# Altium footprint library PcbLib1.PcbLib: 148 footprints (part 2 of 10)
Each footprint in its own frame and in the unit in brackets; x right, y up, seen from the top. Pads: shape width x height; smd on the part's side, far side on the other; paste and mask are expansions set on the pad; w line width, h text height; cw(c..) or ccw(c..) is an arc to the next point about the centre after c.
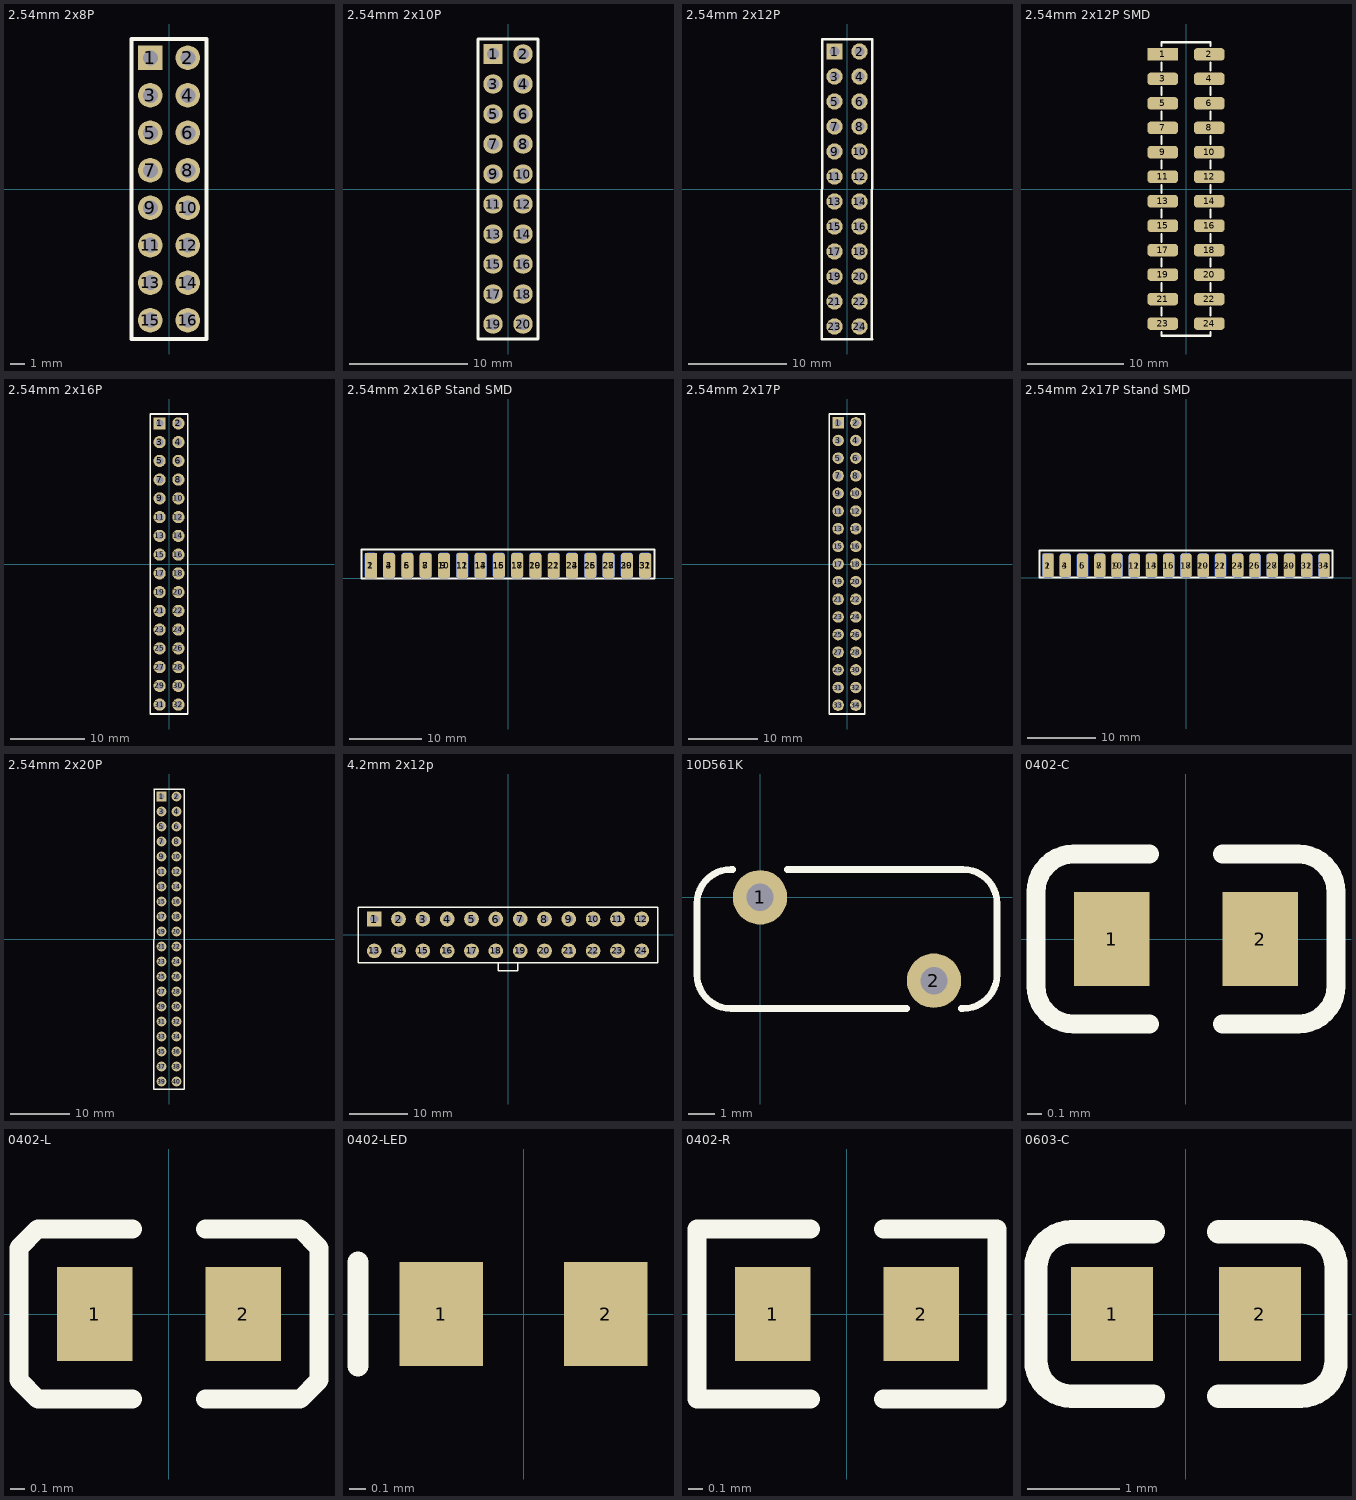
[diagram p1: the footprints below, top view; thin cyan lines are the x and y axes]

## 2.54mm 2x8P [mil]
pads (16):
  rect 65x65 hole 40: 1(-50,350)
  round 65 hole 40: 2(50,350) 3(-50,250) 4(50,250) 5(-50,150) 6(50,150) 7(-50,50) 8(50,50) 9(-50,-50) 10(50,-50) 11(-50,-150) 12(50,-150) 13(-50,-250) 14(50,-250) 15(-50,-350) 16(50,-350)
Top Overlay:
  lines w10: -100,-400 -100,400 100,400 100,-400 -100,-400

## 2.54mm 2x10P [mil]
pads (20):
  rect 65x65 hole 40: 1(-50,450)
  round 65 hole 40: 2(50,450) 3(-50,350) 4(50,350) 5(-50,250) 6(50,250) 7(-50,150) 8(50,150) 9(-50,50) 10(50,50) 11(-50,-50) 12(50,-50) 13(-50,-150) 14(50,-150) 15(-50,-250) 16(50,-250) 17(-50,-350) 18(50,-350) 19(-50,-450) 20(50,-450)
Top Overlay:
  lines w10: -100,-500 100,-500 100,500 -100,500 -100,-500

## 2.54mm 2x12P [mil]
pads (24):
  rect 65x65 hole 40: 1(-50,550)
  round 65 hole 40: 2(50,550) 3(-50,450) 4(50,450) 5(-50,350) 6(50,350) 7(-50,250) 8(50,250) 9(-50,150) 10(50,150) 11(-50,50) 12(50,50) 13(-50,-50) 14(50,-50) 15(-50,-150) 16(50,-150) 17(-50,-250) 18(50,-250) 19(-50,-350) 20(50,-350) 21(-50,-450) 22(50,-450) 23(-50,-550) 24(50,-550)
Top Overlay:
  lines w10: -100,-600 -100,600 100,600 100,-600 -100,-600

## 2.54mm 2x12P SMD [mil]
pads (24):
  rect 125x50 smd: 1(-95,550)
  rrect50% 125x50 smd: 2(95,550) 3(-95,450) 4(95,450) 5(-95,350) 6(95,350) 7(-95,250) 8(95,250) 9(-95,150) 10(95,150) 11(-95,50) 12(95,50) 13(-95,-50) 14(95,-50) 15(-95,-150) 16(95,-150) 17(-95,-250) 18(95,-250) 19(-95,-350) 20(95,-350) 21(-95,-450) 22(95,-450) 23(-95,-550) 24(95,-550)
Top Overlay:
  lines w10: -100,-585 -100,-600 100,-600 100,-585 ; -100,-515 -100,-485 ; -100,-415 -100,-385 ; -100,-315 -100,-285 ; -100,-215 -100,-185 ; -100,-115 -100,-85 ; -100,-15 -100,15 ; -100,85 -100,115 ; -100,185 -100,215 ; -100,285 -100,315 ; -100,385 -100,415 ; -100,485 -100,515 ; -100,585 -100,600 100,600 100,585 ; 100,-515 100,-485 ; 100,-415 100,-385 ; 100,-315 100,-285 ; 100,-215 100,-185 ; 100,-115 100,-85 ; 100,-15 100,15 ; 100,85 100,115 ; 100,185 100,215 ; 100,285 100,315 ; 100,385 100,415 ; 100,485 100,515

## 2.54mm 2x16P [mil]
pads (32):
  rect 65x65 hole 40: 1(-50,750)
  round 65 hole 40: 2(50,750) 3(-50,650) 4(50,650) 5(-50,550) 6(50,550) 7(-50,450) 8(50,450) 9(-50,350) 10(50,350) 11(-50,250) 12(50,250) 13(-50,150) 14(50,150) 15(-50,50) 16(50,50) 17(-50,-50) 18(50,-50) 19(-50,-150) 20(50,-150) 21(-50,-250) 22(50,-250) 23(-50,-350) 24(50,-350) 25(-50,-450) 26(50,-450) 27(-50,-550) 28(50,-550) 29(-50,-650) 30(50,-650) 31(-50,-750) 32(50,-750)
Top Overlay:
  lines w10: -100,-800 -100,800 100,800 100,-800 -100,-800

## 2.54mm 2x16P Stand SMD [mil]
pads (32):
  rect 65x140 smd: 1(-750,70)
  rrect50% 65x140 smd far side: 2(-750,70) 4(-650,70) 6(-550,70) 8(-450,70) 10(-350,70) 12(-250,70) 14(-150,70) 16(-50,70) 18(50,70) 20(150,70) 22(250,70) 24(350,70) 26(450,70) 28(550,70) 30(650,70) 32(750,70)
  rrect50% 65x140 smd: 3(-650,70) 5(-550,70) 7(-450,70) 9(-350,70) 11(-250,70) 13(-150,70) 15(-50,70) 17(50,70) 19(150,70) 21(250,70) 23(350,70) 25(450,70) 27(550,70) 29(650,70) 31(750,70)
Top Overlay:
  lines w10: -800,0 -800,157.5 800,157.5 800,0 -800,0
Bottom Overlay:
  lines w10: -800,0 -800,157.5 800,157.5 800,0 -800,0

## 2.54mm 2x17P [mil]
pads (34):
  rect 65x65 hole 40: 1(-50,800)
  round 65 hole 40: 2(50,800) 3(-50,700) 4(50,700) 5(-50,600) 6(50,600) 7(-50,500) 8(50,500) 9(-50,400) 10(50,400) 11(-50,300) 12(50,300) 13(-50,200) 14(50,200) 15(-50,100) 16(50,100) 17(-50,0) 18(50,0) 19(-50,-100) 20(50,-100) 21(-50,-200) 22(50,-200) 23(-50,-300) 24(50,-300) 25(-50,-400) 26(50,-400) 27(-50,-500) 28(50,-500) 29(-50,-600) 30(50,-600) 31(-50,-700) 32(50,-700) 33(-50,-800) 34(50,-800)
Top Overlay:
  lines w10: -100,-850 100,-850 100,850 -100,850 -100,-850

## 2.54mm 2x17P Stand SMD [mil]
pads (34):
  rect 65x140 smd: 1(-800,70)
  rrect50% 65x140 smd far side: 2(-800,70) 4(-700,70) 6(-600,70) 8(-500,70) 10(-400,70) 12(-300,70) 14(-200,70) 16(-100,70) 18(0,70) 20(100,70) 22(200,70) 24(300,70) 26(400,70) 28(500,70) 30(600,70) 32(700,70) 34(800,70)
  rrect50% 65x140 smd: 3(-700,70) 5(-600,70) 7(-500,70) 9(-400,70) 11(-300,70) 13(-200,70) 15(-100,70) 17(0,70) 19(100,70) 21(200,70) 23(300,70) 25(400,70) 27(500,70) 29(600,70) 31(700,70) 33(800,70)
Top Overlay:
  lines w10: -850,0 -850,157.5 850,157.5 850,0 -850,0
Bottom Overlay:
  lines w10: -850,0 -850,157.5 850,157.5 850,0 -850,0

## 2.54mm 2x20P [mil]
pads (40):
  rect 65x65 hole 40: 1(-50,950)
  round 65 hole 40: 2(50,950) 3(-50,850) 4(50,850) 5(-50,750) 6(50,750) 7(-50,650) 8(50,650) 9(-50,550) 10(50,550) 11(-50,450) 12(50,450) 13(-50,350) 14(50,350) 15(-50,250) 16(50,250) 17(-50,150) 18(50,150) 19(-50,50) 20(50,50) 21(-50,-50) 22(50,-50) 23(-50,-150) 24(50,-150) 25(-50,-250) 26(50,-250) 27(-50,-350) 28(50,-350) 29(-50,-450) 30(50,-450) 31(-50,-550) 32(50,-550) 33(-50,-650) 34(50,-650) 35(-50,-750) 36(50,-750) 37(-50,-850) 38(50,-850) 39(-50,-950) 40(50,-950)
Top Overlay:
  lines w10: -100,-1000 -100,1000 100,1000 100,-1000 -100,-1000

## 4.2mm 2x12p [mm]
pads (24):
  rect 2.54x2.54 hole 1.397: 1(-23.1,2.75)
  round 2.54 hole 1.397: 2(-18.9,2.75) 3(-14.7,2.75) 4(-10.5,2.75) 5(-6.3,2.75) 6(-2.1,2.75) 7(2.1,2.75) 8(6.3,2.75) 9(10.5,2.75) 10(14.7,2.75) 11(18.9,2.75) 12(23.1,2.75) 13(-23.1,-2.75) 14(-18.9,-2.75) 15(-14.7,-2.75) 16(-10.5,-2.75) 17(-6.3,-2.75) 18(-2.1,-2.75) 19(2.1,-2.75) 20(6.3,-2.75) 21(10.5,-2.75) 22(14.7,-2.75) 23(18.9,-2.75) 24(23.1,-2.75)
Top Overlay:
  lines w0.254: -1.7,-4.8 -1.7,-6.2 1.7,-6.2 1.7,-4.8 ; -25.9,-4.8 25.9,-4.8 25.9,4.8 -25.9,4.8 -25.9,-4.8

## 10D561K [mil]
pads (2):
  round 80 hole 40: 1(0,0) 2(255.66,-122.44)
Top Overlay:
  lines w10: -40,41.14 -42.64,41.14 ccw(c-42.64,-8.86) -92.64,-8.86 -92.64,-113.58 ccw(c-42.64,-113.58) -42.64,-163.58 215.66,-163.58 ; 40,41.14 298.3,41.14 cw(c298.3,-8.86) 348.3,-8.86 348.3,-113.58 cw(c298.3,-113.58) 298.3,-163.58 295.66,-163.58

## 0402-C [mil]
pads (2):
  rect 20x25 smd: 1(-19.68,0) 2(19.69,0)
Top Overlay:
  lines w5: -9.69,-22.5 -29.68,-22.5 cw(c-29.68,-12.5) -39.69,-12.5 -39.69,12.5 cw(c-29.68,12.5) -29.68,22.5 -9.69,22.5 ; 9.69,-22.5 29.69,-22.5 ccw(c29.69,-12.5) 39.69,-12.5 39.69,12.5 ccw(c29.69,12.5) 29.69,22.5 9.69,22.5
3D body "0402-C.step": height 22.01, standoff 0, extent -22.01,-12.01 22.01,12.01

## 0402-L [mil]
pads (2):
  rect 20x25 smd: 1(-19.68,0) 2(19.69,0)
Top Overlay:
  lines w5: -9.69,-22.5 -34.69,-22.5 -39.69,-17.5 -39.69,17.5 -34.69,22.5 -9.69,22.5 ; 9.69,-22.5 34.69,-22.5 39.69,-17.5 39.69,17.5 34.69,22.5 9.69,22.5

## 0402-LED [mil]
pads (2):
  rect 20x25 smd: 1(-19.68,0) 2(19.69,0)
Top Overlay:
  lines w5: -39.69,-12.5 -39.69,12.5

## 0402-R [mil]
pads (2):
  rect 20x25 smd: 1(-19.68,0) 2(19.69,0)
Top Overlay:
  lines w5: -9.69,-22.5 -39.69,-22.5 -39.69,22.5 -9.69,22.5 ; 9.69,-22.5 39.69,-22.5 39.69,22.5 9.69,22.5
3D body "0402-R.step": height 15.98, standoff 0, extent -20.98,-10.98 20.98,10.98

## 0603-C [mil]
pads (2):
  rect 35x40 smd: 1(-31.5,0) 2(31.5,0)
Top Overlay:
  lines w10: -14,-35 -49,-35 cw(c-49,-20) -64,-20 -64,20 cw(c-49,20) -49,35 -14,35 ; 14,-35 49,-35 ccw(c49,-20) 64,-20 64,20 ccw(c49,20) 49,35 14,35
3D body "0603-C.step": height 30, standoff 0, extent -31.5,-15 31.5,15